# Altium schematic symbol library jlcpcb_2025_04_capacitors_extended_0201.schlib: 1175 symbols (part 5 of 7) (continued)
## GRM0335C1E160GA01D
designator C?  Capacitance: 16pF  (hidden comment: *)
Capacitor, Ceramic (MLCC), 16pF, ±2%, 25V, C0G, ±2%, SMD 0201; Manufacturer: Murata Electronics; Manufacturer Part Number: GRM0335C1E160GA01D; Package Size: 0201; JLCPCB Basic Part: No; JLCPCB Part Number: C3034518; Supplier 1: LCSC; Category: Capacitors - MLCC; Supplier Part Number 1: C3034518; Tolerance: ±2%; Voltage Rating: 25V; Temperature Coefficient: C0G; RoHS: Yes; ComponentLink1Description: Datasheet; ComponentLink1URL: https://wmsc.lcsc.com/wmsc/upload/file/pdf/v2/lcsc/2209091800_Murata-Electronics-GRM0335C1E160GA01D_C3034518.pdf; ComponentLink2Description: JLCPCB Part URL; ComponentLink2URL: https://jlcpcb.com/partdetail/C3034518; ComponentLink3Description: LCSC Part URL; ComponentLink3URL: https://lcsc.com/product-detail/Multilayer-Ceramic-Capacitors-MLCC---SMD-SMT_Murata-Electronics-Murata-Electronics-GRM0335C1E160GA01D_C3034518.html
footprint CAP-0201 (0201 (0603M) Capacitor)
pins: 1, 2

## GRM0335C1E160JA01D
designator C?  Capacitance: 16pF  (hidden comment: *)
Capacitor, Ceramic (MLCC), 16pF, ±5%, 25V, C0G, ±5%, SMD 0201; Manufacturer: Murata Electronics; Manufacturer Part Number: GRM0335C1E160JA01D; Package Size: 0201; JLCPCB Basic Part: No; JLCPCB Part Number: C3034517; Supplier 1: LCSC; Category: Capacitors - MLCC; Supplier Part Number 1: C3034517; Tolerance: ±5%; Voltage Rating: 25V; Temperature Coefficient: C0G; RoHS: Yes; ComponentLink1Description: Datasheet; ComponentLink1URL: https://wmsc.lcsc.com/wmsc/upload/file/pdf/v2/lcsc/2209091800_Murata-Electronics-GRM0335C1E160JA01D_C3034517.pdf; ComponentLink2Description: JLCPCB Part URL; ComponentLink2URL: https://jlcpcb.com/partdetail/C3034517; ComponentLink3Description: LCSC Part URL; ComponentLink3URL: https://lcsc.com/product-detail/Multilayer-Ceramic-Capacitors-MLCC---SMD-SMT_Murata-Electronics-Murata-Electronics-GRM0335C1E160JA01D_C3034517.html
footprint CAP-0201 (0201 (0603M) Capacitor)
pins: 1, 2

## GRM0335C1E180GA01D
designator C?  Capacitance: 18pF  (hidden comment: *)
Capacitor, Ceramic (MLCC), 18pF, ±2%, 25V, C0G, ±2%, SMD 0201; Manufacturer: Murata Electronics; Manufacturer Part Number: GRM0335C1E180GA01D; Package Size: 0201; JLCPCB Basic Part: No; JLCPCB Part Number: C161374; Supplier 1: LCSC; Category: Capacitors - MLCC; Supplier Part Number 1: C161374; Tolerance: ±2%; Voltage Rating: 25V; Temperature Coefficient: C0G; RoHS: Yes; ComponentLink1Description: Datasheet; ComponentLink1URL: https://wmsc.lcsc.com/wmsc/upload/file/pdf/v2/lcsc/1811081551_Murata-Electronics-GRM0335C1E180GA01D_C161374.pdf; ComponentLink2Description: JLCPCB Part URL; ComponentLink2URL: https://jlcpcb.com/partdetail/C161374; ComponentLink3Description: LCSC Part URL; ComponentLink3URL: https://lcsc.com/product-detail/Multilayer-Ceramic-Capacitors-MLCC---SMD-SMT_Murata-Electronics-Murata-Electronics-GRM0335C1E180GA01D_C161374.html
footprint CAP-0201 (0201 (0603M) Capacitor)
pins: 1, 2

## GRM0335C1E180JA01D
designator C?  Capacitance: 18pF  (hidden comment: *)
Capacitor, Ceramic (MLCC), 18pF, ±5%, 25V, C0G, ±5%, SMD 0201; Manufacturer: Murata Electronics; Manufacturer Part Number: GRM0335C1E180JA01D; Package Size: 0201; JLCPCB Basic Part: No; JLCPCB Part Number: C161375; Supplier 1: LCSC; Category: Capacitors - MLCC; Supplier Part Number 1: C161375; Tolerance: ±5%; Voltage Rating: 25V; Temperature Coefficient: C0G; RoHS: Yes; ComponentLink1Description: Datasheet; ComponentLink1URL: https://wmsc.lcsc.com/wmsc/upload/file/pdf/v2/lcsc/1912111437_Murata-Electronics-GRM0335C1E180JA01D_C161375.pdf; ComponentLink2Description: JLCPCB Part URL; ComponentLink2URL: https://jlcpcb.com/partdetail/C161375; ComponentLink3Description: LCSC Part URL; ComponentLink3URL: https://lcsc.com/product-detail/Multilayer-Ceramic-Capacitors-MLCC---SMD-SMT_Murata-Electronics-Murata-Electronics-GRM0335C1E180JA01D_C161375.html
footprint CAP-0201 (0201 (0603M) Capacitor)
pins: 1, 2

## GRM0335C1E200JA01D
designator C?  Capacitance: 20pF  (hidden comment: *)
Capacitor, Ceramic (MLCC), 20pF, ±5%, 25V, C0G, ±5%, SMD 0201; Manufacturer: Murata Electronics; Manufacturer Part Number: GRM0335C1E200JA01D; Package Size: 0201; JLCPCB Basic Part: No; JLCPCB Part Number: C426053; Supplier 1: LCSC; Category: Capacitors - MLCC; Supplier Part Number 1: C426053; Tolerance: ±5%; Voltage Rating: 25V; Temperature Coefficient: C0G; RoHS: Yes; ComponentLink1Description: Datasheet; ComponentLink1URL: https://wmsc.lcsc.com/wmsc/upload/file/pdf/v2/lcsc/2304140030_Murata-Electronics-GRM0335C1E200JA01D_C426053.pdf; ComponentLink2Description: JLCPCB Part URL; ComponentLink2URL: https://jlcpcb.com/partdetail/C426053; ComponentLink3Description: LCSC Part URL; ComponentLink3URL: https://lcsc.com/product-detail/Multilayer-Ceramic-Capacitors-MLCC---SMD-SMT_Murata-Electronics-Murata-Electronics-GRM0335C1E200JA01D_C426053.html
footprint CAP-0201 (0201 (0603M) Capacitor)
pins: 1, 2

## GRM0335C1E220FA01D
designator C?  Capacitance: 22pF  (hidden comment: *)
Capacitor, Ceramic (MLCC), 22pF, ±1%, 25V, C0G, ±1%, SMD 0201; Manufacturer: Murata Electronics; Manufacturer Part Number: GRM0335C1E220FA01D; Package Size: 0201; JLCPCB Basic Part: No; JLCPCB Part Number: C464960; Supplier 1: LCSC; Category: Capacitors - MLCC; Supplier Part Number 1: C464960; Tolerance: ±1%; Voltage Rating: 25V; Temperature Coefficient: C0G; RoHS: Yes; ComponentLink1Description: Datasheet; ComponentLink1URL: https://wmsc.lcsc.com/wmsc/upload/file/pdf/v2/lcsc/1912111437_Murata-Electronics-GRM0335C1E220FA01D_C464960.pdf; ComponentLink2Description: JLCPCB Part URL; ComponentLink2URL: https://jlcpcb.com/partdetail/C464960; ComponentLink3Description: LCSC Part URL; ComponentLink3URL: https://lcsc.com/product-detail/Multilayer-Ceramic-Capacitors-MLCC---SMD-SMT_Murata-Electronics-Murata-Electronics-GRM0335C1E220FA01D_C464960.html
footprint CAP-0201 (0201 (0603M) Capacitor)
pins: 1, 2

## GRM0335C1E220GA01D
designator C?  Capacitance: 22pF  (hidden comment: *)
Capacitor, Ceramic (MLCC), 22pF, ±2%, 25V, null, ±2%, SMD 0201; Manufacturer: Murata Electronics; Manufacturer Part Number: GRM0335C1E220GA01D; Package Size: 0201; JLCPCB Basic Part: No; JLCPCB Part Number: C710796; Supplier 1: LCSC; Category: Capacitors - MLCC; Supplier Part Number 1: C710796; Tolerance: ±2%; Voltage Rating: 25V; Temperature Coefficient: null; RoHS: Yes; ComponentLink1Description: Datasheet; ComponentLink1URL: https://wmsc.lcsc.com/wmsc/upload/file/pdf/v2/lcsc/2304140030_Murata-Electronics-GRM0335C1E220GA01D_C710796.pdf; ComponentLink2Description: JLCPCB Part URL; ComponentLink2URL: https://jlcpcb.com/partdetail/C710796; ComponentLink3Description: LCSC Part URL; ComponentLink3URL: https://lcsc.com/product-detail/Multilayer-Ceramic-Capacitors-MLCC---SMD-SMT_Murata-Electronics-Murata-Electronics-GRM0335C1E220GA01D_C710796.html
footprint CAP-0201 (0201 (0603M) Capacitor)
pins: 1, 2

## GRM0335C1E220JA01D
designator C?  Capacitance: 22pF  (hidden comment: *)
Capacitor, Ceramic (MLCC), 22pF, ±5%, 25V, C0G, ±5%, SMD 0201; Manufacturer: Murata Electronics; Manufacturer Part Number: GRM0335C1E220JA01D; Package Size: 0201; JLCPCB Basic Part: No; JLCPCB Part Number: C76919; Supplier 1: LCSC; Category: Capacitors - MLCC; Supplier Part Number 1: C76919; Tolerance: ±5%; Voltage Rating: 25V; Temperature Coefficient: C0G; RoHS: Yes; ComponentLink1Description: Datasheet; ComponentLink1URL: https://wmsc.lcsc.com/wmsc/upload/file/pdf/v2/lcsc/1811081513_Murata-Electronics-GRM0335C1E220JA01D_C76919.pdf; ComponentLink2Description: JLCPCB Part URL; ComponentLink2URL: https://jlcpcb.com/partdetail/C76919; ComponentLink3Description: LCSC Part URL; ComponentLink3URL: https://lcsc.com/product-detail/Multilayer-Ceramic-Capacitors-MLCC---SMD-SMT_Murata-Electronics-Murata-Electronics-GRM0335C1E220JA01D_C76919.html
footprint CAP-0201 (0201 (0603M) Capacitor)
pins: 1, 2

## GRM0335C1E220JA01J
designator C?  Capacitance: 22pF  (hidden comment: *)
Capacitor, Ceramic (MLCC), 22pF, ±5%, 25V, C0G, ±5%, SMD 0201; Manufacturer: Murata Electronics; Manufacturer Part Number: GRM0335C1E220JA01J; Package Size: 0201; JLCPCB Basic Part: No; JLCPCB Part Number: C490387; Supplier 1: LCSC; Category: Capacitors - MLCC; Supplier Part Number 1: C490387; Tolerance: ±5%; Voltage Rating: 25V; Temperature Coefficient: C0G; RoHS: Yes; ComponentLink1Description: Datasheet; ComponentLink1URL: https://wmsc.lcsc.com/wmsc/upload/file/pdf/v2/lcsc/2304140030_Murata-Electronics-GRM0335C1E220JA01J_C490387.pdf; ComponentLink2Description: JLCPCB Part URL; ComponentLink2URL: https://jlcpcb.com/partdetail/C490387; ComponentLink3Description: LCSC Part URL; ComponentLink3URL: https://lcsc.com/product-detail/Multilayer-Ceramic-Capacitors-MLCC---SMD-SMT_Murata-Electronics-Murata-Electronics-GRM0335C1E220JA01J_C490387.html
footprint CAP-0201 (0201 (0603M) Capacitor)
pins: 1, 2

## GRM0335C1E221JA01D
designator C?  Capacitance: 220pF  (hidden comment: *)
Capacitor, Ceramic (MLCC), 220pF, ±5%, 25V, C0G, ±5%, SMD 0201; Manufacturer: Murata Electronics; Manufacturer Part Number: GRM0335C1E221JA01D; Package Size: 0201; JLCPCB Basic Part: No; JLCPCB Part Number: C907939; Supplier 1: LCSC; Category: Capacitors - MLCC; Supplier Part Number 1: C907939; Tolerance: ±5%; Voltage Rating: 25V; Temperature Coefficient: C0G; RoHS: Yes; ComponentLink1Description: Datasheet; ComponentLink1URL: https://wmsc.lcsc.com/wmsc/upload/file/pdf/v2/lcsc/2201242100_Murata-Electronics-GRM0335C1E221JA01D_C907939.pdf; ComponentLink2Description: JLCPCB Part URL; ComponentLink2URL: https://jlcpcb.com/partdetail/C907939; ComponentLink3Description: LCSC Part URL; ComponentLink3URL: https://lcsc.com/product-detail/Multilayer-Ceramic-Capacitors-MLCC---SMD-SMT_Murata-Electronics-Murata-Electronics-GRM0335C1E221JA01D_C907939.html
footprint CAP-0201 (0201 (0603M) Capacitor)
pins: 1, 2

## GRM0335C1E270FA01D
designator C?  Capacitance: 27pF  (hidden comment: *)
Capacitor, Ceramic (MLCC), 27pF, ±1%, 25V, C0G, ±1%, SMD 0201; Manufacturer: Murata Electronics; Manufacturer Part Number: GRM0335C1E270FA01D; Package Size: 0201; JLCPCB Basic Part: No; JLCPCB Part Number: C710798; Supplier 1: LCSC; Category: Capacitors - MLCC; Supplier Part Number 1: C710798; Tolerance: ±1%; Voltage Rating: 25V; Temperature Coefficient: C0G; RoHS: Yes; ComponentLink1Description: Datasheet; ComponentLink1URL: https://wmsc.lcsc.com/wmsc/upload/file/pdf/v2/lcsc/2210190600_Murata-Electronics-GRM0335C1E270FA01D_C710798.pdf; ComponentLink2Description: JLCPCB Part URL; ComponentLink2URL: https://jlcpcb.com/partdetail/C710798; ComponentLink3Description: LCSC Part URL; ComponentLink3URL: https://lcsc.com/product-detail/Multilayer-Ceramic-Capacitors-MLCC---SMD-SMT_Murata-Electronics-Murata-Electronics-GRM0335C1E270FA01D_C710798.html
footprint CAP-0201 (0201 (0603M) Capacitor)
pins: 1, 2

## GRM0335C1E270JA01D
designator C?  Capacitance: 27pF  (hidden comment: *)
Capacitor, Ceramic (MLCC), 27pF, ±5%, 25V, C0G, ±5%, SMD 0201; Manufacturer: Murata Electronics; Manufacturer Part Number: GRM0335C1E270JA01D; Package Size: 0201; JLCPCB Basic Part: No; JLCPCB Part Number: C161381; Supplier 1: LCSC; Category: Capacitors - MLCC; Supplier Part Number 1: C161381; Tolerance: ±5%; Voltage Rating: 25V; Temperature Coefficient: C0G; RoHS: Yes; ComponentLink1Description: Datasheet; ComponentLink1URL: https://wmsc.lcsc.com/wmsc/upload/file/pdf/v2/lcsc/1811081545_Murata-Electronics-GRM0335C1E270JA01D_C161381.pdf; ComponentLink2Description: JLCPCB Part URL; ComponentLink2URL: https://jlcpcb.com/partdetail/C161381; ComponentLink3Description: LCSC Part URL; ComponentLink3URL: https://lcsc.com/product-detail/Multilayer-Ceramic-Capacitors-MLCC---SMD-SMT_Murata-Electronics-Murata-Electronics-GRM0335C1E270JA01D_C161381.html
footprint CAP-0201 (0201 (0603M) Capacitor)
pins: 1, 2

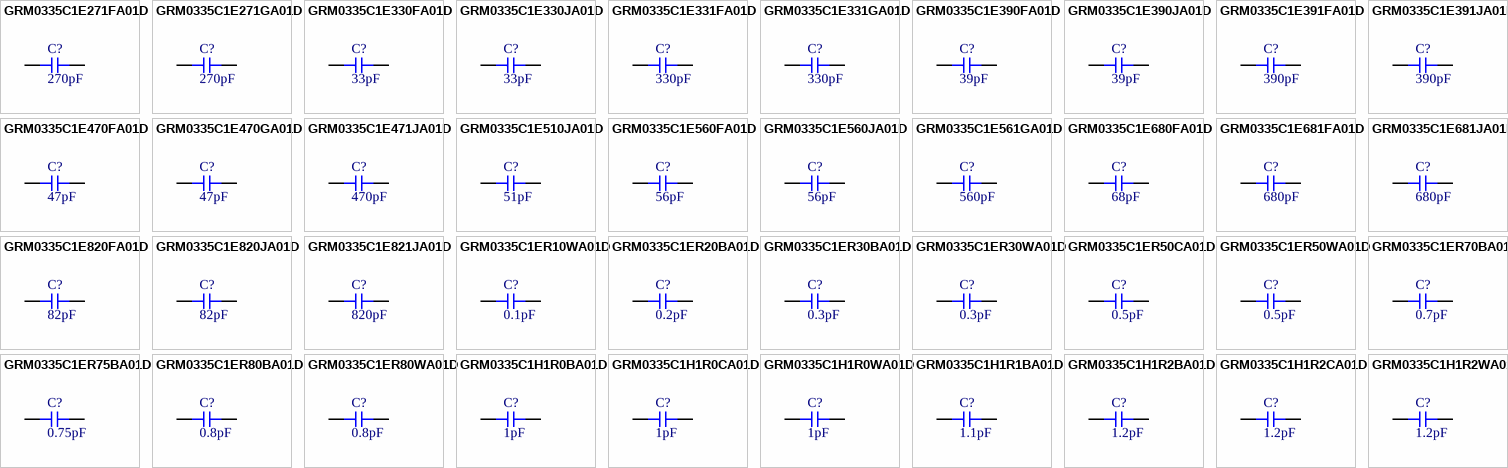
[diagram p21: symbols GRM0335C1E271FA01D to GRM0335C1H1R2WA01D]

## GRM0335C1E271FA01D
designator C?  Capacitance: 270pF  (hidden comment: *)
Capacitor, Ceramic (MLCC), 270pF, ±1%, 25V, C0G, ±1%, SMD 0201; Manufacturer: Murata Electronics; Manufacturer Part Number: GRM0335C1E271FA01D; Package Size: 0201; JLCPCB Basic Part: No; JLCPCB Part Number: C1864394; Supplier 1: LCSC; Category: Capacitors - MLCC; Supplier Part Number 1: C1864394; Tolerance: ±1%; Voltage Rating: 25V; Temperature Coefficient: C0G; RoHS: Yes; ComponentLink1Description: Datasheet; ComponentLink1URL: https://wmsc.lcsc.com/wmsc/upload/file/pdf/v2/lcsc/2201271800_Murata-Electronics-GRM0335C1E271FA01D_C1864394.pdf; ComponentLink2Description: JLCPCB Part URL; ComponentLink2URL: https://jlcpcb.com/partdetail/C1864394; ComponentLink3Description: LCSC Part URL; ComponentLink3URL: https://lcsc.com/product-detail/Multilayer-Ceramic-Capacitors-MLCC---SMD-SMT_Murata-Electronics-Murata-Electronics-GRM0335C1E271FA01D_C1864394.html
footprint CAP-0201 (0201 (0603M) Capacitor)
pins: 1, 2

## GRM0335C1E271GA01D
designator C?  Capacitance: 270pF  (hidden comment: *)
Capacitor, Ceramic (MLCC), 270pF, ±2%, 25V, C0G, ±2%, SMD 0201; Manufacturer: Murata Electronics; Manufacturer Part Number: GRM0335C1E271GA01D; Package Size: 0201; JLCPCB Basic Part: No; JLCPCB Part Number: C384945; Supplier 1: LCSC; Category: Capacitors - MLCC; Supplier Part Number 1: C384945; Tolerance: ±2%; Voltage Rating: 25V; Temperature Coefficient: C0G; RoHS: Yes; ComponentLink1Description: Datasheet; ComponentLink1URL: https://wmsc.lcsc.com/wmsc/upload/file/pdf/v2/lcsc/2210192300_Murata-Electronics-GRM0335C1E271GA01D_C384945.pdf; ComponentLink2Description: JLCPCB Part URL; ComponentLink2URL: https://jlcpcb.com/partdetail/C384945; ComponentLink3Description: LCSC Part URL; ComponentLink3URL: https://lcsc.com/product-detail/Multilayer-Ceramic-Capacitors-MLCC---SMD-SMT_Murata-Electronics-Murata-Electronics-GRM0335C1E271GA01D_C384945.html
footprint CAP-0201 (0201 (0603M) Capacitor)
pins: 1, 2

## GRM0335C1E330FA01D
designator C?  Capacitance: 33pF  (hidden comment: *)
Capacitor, Ceramic (MLCC), 33pF, ±1%, 25V, C0G, ±1%, SMD 0201; Manufacturer: Murata Electronics; Manufacturer Part Number: GRM0335C1E330FA01D; Package Size: 0201; JLCPCB Basic Part: No; JLCPCB Part Number: C668338; Supplier 1: LCSC; Category: Capacitors - MLCC; Supplier Part Number 1: C668338; Tolerance: ±1%; Voltage Rating: 25V; Temperature Coefficient: C0G; RoHS: Yes; ComponentLink1Description: Datasheet; ComponentLink1URL: https://wmsc.lcsc.com/wmsc/upload/file/pdf/v2/lcsc/2201111000_Murata-Electronics-GRM0335C1E330FA01D_C668338.pdf; ComponentLink2Description: JLCPCB Part URL; ComponentLink2URL: https://jlcpcb.com/partdetail/C668338; ComponentLink3Description: LCSC Part URL; ComponentLink3URL: https://lcsc.com/product-detail/Multilayer-Ceramic-Capacitors-MLCC---SMD-SMT_Murata-Electronics-Murata-Electronics-GRM0335C1E330FA01D_C668338.html
footprint CAP-0201 (0201 (0603M) Capacitor)
pins: 1, 2

## GRM0335C1E330JA01D
designator C?  Capacitance: 33pF  (hidden comment: *)
Capacitor, Ceramic (MLCC), 33pF, ±5%, 25V, C0G, ±5%, SMD 0201; Manufacturer: Murata Electronics; Manufacturer Part Number: GRM0335C1E330JA01D; Package Size: 0201; JLCPCB Basic Part: No; JLCPCB Part Number: C88906; Supplier 1: LCSC; Category: Capacitors - MLCC; Supplier Part Number 1: C88906; Tolerance: ±5%; Voltage Rating: 25V; Temperature Coefficient: C0G; RoHS: Yes; ComponentLink1Description: Datasheet; ComponentLink1URL: https://wmsc.lcsc.com/wmsc/upload/file/pdf/v2/lcsc/2304140030_Murata-Electronics-GRM0335C1E330JA01D_C88906.pdf; ComponentLink2Description: JLCPCB Part URL; ComponentLink2URL: https://jlcpcb.com/partdetail/C88906; ComponentLink3Description: LCSC Part URL; ComponentLink3URL: https://lcsc.com/product-detail/Multilayer-Ceramic-Capacitors-MLCC---SMD-SMT_Murata-Electronics-Murata-Electronics-GRM0335C1E330JA01D_C88906.html
footprint CAP-0201 (0201 (0603M) Capacitor)
pins: 1, 2

## GRM0335C1E331FA01D
designator C?  Capacitance: 330pF  (hidden comment: *)
Capacitor, Ceramic (MLCC), 330pF, ±1%, 25V, C0G, ±1%, SMD 0201; Manufacturer: Murata Electronics; Manufacturer Part Number: GRM0335C1E331FA01D; Package Size: 0201; JLCPCB Basic Part: No; JLCPCB Part Number: C3034513; Supplier 1: LCSC; Category: Capacitors - MLCC; Supplier Part Number 1: C3034513; Tolerance: ±1%; Voltage Rating: 25V; Temperature Coefficient: C0G; RoHS: Yes; ComponentLink1Description: Datasheet; ComponentLink1URL: https://wmsc.lcsc.com/wmsc/upload/file/pdf/v2/lcsc/2209091800_Murata-Electronics-GRM0335C1E331FA01D_C3034513.pdf; ComponentLink2Description: JLCPCB Part URL; ComponentLink2URL: https://jlcpcb.com/partdetail/C3034513; ComponentLink3Description: LCSC Part URL; ComponentLink3URL: https://lcsc.com/product-detail/Multilayer-Ceramic-Capacitors-MLCC---SMD-SMT_Murata-Electronics-Murata-Electronics-GRM0335C1E331FA01D_C3034513.html
footprint CAP-0201 (0201 (0603M) Capacitor)
pins: 1, 2

## GRM0335C1E331GA01D
designator C?  Capacitance: 330pF  (hidden comment: *)
Capacitor, Ceramic (MLCC), 330pF, ±2%, 25V, C0G, ±2%, SMD 0201; Manufacturer: Murata Electronics; Manufacturer Part Number: GRM0335C1E331GA01D; Package Size: 0201; JLCPCB Basic Part: No; JLCPCB Part Number: C437509; Supplier 1: LCSC; Category: Capacitors - MLCC; Supplier Part Number 1: C437509; Tolerance: ±2%; Voltage Rating: 25V; Temperature Coefficient: C0G; RoHS: Yes; ComponentLink1Description: Datasheet; ComponentLink1URL: https://wmsc.lcsc.com/wmsc/upload/file/pdf/v2/lcsc/2304140030_Murata-Electronics-GRM0335C1E331GA01D_C437509.pdf; ComponentLink2Description: JLCPCB Part URL; ComponentLink2URL: https://jlcpcb.com/partdetail/C437509; ComponentLink3Description: LCSC Part URL; ComponentLink3URL: https://lcsc.com/product-detail/Multilayer-Ceramic-Capacitors-MLCC---SMD-SMT_Murata-Electronics-Murata-Electronics-GRM0335C1E331GA01D_C437509.html
footprint CAP-0201 (0201 (0603M) Capacitor)
pins: 1, 2

## GRM0335C1E390FA01D
designator C?  Capacitance: 39pF  (hidden comment: *)
Capacitor, Ceramic (MLCC), 39pF, ±1%, 25V, C0G, ±1%, SMD 0201; Manufacturer: Murata Electronics; Manufacturer Part Number: GRM0335C1E390FA01D; Package Size: 0201; JLCPCB Basic Part: No; JLCPCB Part Number: C3011647; Supplier 1: LCSC; Category: Capacitors - MLCC; Supplier Part Number 1: C3011647; Tolerance: ±1%; Voltage Rating: 25V; Temperature Coefficient: C0G; RoHS: Yes; ComponentLink1Description: Datasheet; ComponentLink1URL: https://wmsc.lcsc.com/wmsc/upload/file/pdf/v2/lcsc/2209091800_Murata-Electronics-GRM0335C1E390FA01D_C3011647.pdf; ComponentLink2Description: JLCPCB Part URL; ComponentLink2URL: https://jlcpcb.com/partdetail/C3011647; ComponentLink3Description: LCSC Part URL; ComponentLink3URL: https://lcsc.com/product-detail/Multilayer-Ceramic-Capacitors-MLCC---SMD-SMT_Murata-Electronics-Murata-Electronics-GRM0335C1E390FA01D_C3011647.html
footprint CAP-0201 (0201 (0603M) Capacitor)
pins: 1, 2

## GRM0335C1E390JA01D
designator C?  Capacitance: 39pF  (hidden comment: *)
Capacitor, Ceramic (MLCC), 39pF, ±5%, 25V, C0G, ±5%, SMD 0201; Manufacturer: Murata Electronics; Manufacturer Part Number: GRM0335C1E390JA01D; Package Size: 0201; JLCPCB Basic Part: No; JLCPCB Part Number: C161387; Supplier 1: LCSC; Category: Capacitors - MLCC; Supplier Part Number 1: C161387; Tolerance: ±5%; Voltage Rating: 25V; Temperature Coefficient: C0G; RoHS: Yes; ComponentLink1Description: Datasheet; ComponentLink1URL: https://wmsc.lcsc.com/wmsc/upload/file/pdf/v2/lcsc/2304140030_Murata-Electronics-GRM0335C1E390JA01D_C161387.pdf; ComponentLink2Description: JLCPCB Part URL; ComponentLink2URL: https://jlcpcb.com/partdetail/C161387; ComponentLink3Description: LCSC Part URL; ComponentLink3URL: https://lcsc.com/product-detail/Multilayer-Ceramic-Capacitors-MLCC---SMD-SMT_Murata-Electronics-Murata-Electronics-GRM0335C1E390JA01D_C161387.html
footprint CAP-0201 (0201 (0603M) Capacitor)
pins: 1, 2

## GRM0335C1E391FA01D
designator C?  Capacitance: 390pF  (hidden comment: *)
Capacitor, Ceramic (MLCC), 390pF, ±1%, 25V, C0G, ±1%, SMD 0201; Manufacturer: Murata Electronics; Manufacturer Part Number: GRM0335C1E391FA01D; Package Size: 0201; JLCPCB Basic Part: No; JLCPCB Part Number: C384947; Supplier 1: LCSC; Category: Capacitors - MLCC; Supplier Part Number 1: C384947; Tolerance: ±1%; Voltage Rating: 25V; Temperature Coefficient: C0G; RoHS: Yes; ComponentLink1Description: Datasheet; ComponentLink1URL: https://wmsc.lcsc.com/wmsc/upload/file/pdf/v2/lcsc/1912111437_Murata-Electronics-GRM0335C1E391FA01D_C384947.pdf; ComponentLink2Description: JLCPCB Part URL; ComponentLink2URL: https://jlcpcb.com/partdetail/C384947; ComponentLink3Description: LCSC Part URL; ComponentLink3URL: https://lcsc.com/product-detail/Multilayer-Ceramic-Capacitors-MLCC---SMD-SMT_Murata-Electronics-Murata-Electronics-GRM0335C1E391FA01D_C384947.html
footprint CAP-0201 (0201 (0603M) Capacitor)
pins: 1, 2

## GRM0335C1E391JA01D
designator C?  Capacitance: 390pF  (hidden comment: *)
Capacitor, Ceramic (MLCC), 390pF, ±5%, 25V, C0G, ±5%, SMD 0201; Manufacturer: Murata Electronics; Manufacturer Part Number: GRM0335C1E391JA01D; Package Size: 0201; JLCPCB Basic Part: No; JLCPCB Part Number: C384948; Supplier 1: LCSC; Category: Capacitors - MLCC; Supplier Part Number 1: C384948; Tolerance: ±5%; Voltage Rating: 25V; Temperature Coefficient: C0G; RoHS: Yes; ComponentLink1Description: Datasheet; ComponentLink1URL: https://wmsc.lcsc.com/wmsc/upload/file/pdf/v2/lcsc/2304140030_Murata-Electronics-GRM0335C1E391JA01D_C384948.pdf; ComponentLink2Description: JLCPCB Part URL; ComponentLink2URL: https://jlcpcb.com/partdetail/C384948; ComponentLink3Description: LCSC Part URL; ComponentLink3URL: https://lcsc.com/product-detail/Multilayer-Ceramic-Capacitors-MLCC---SMD-SMT_Murata-Electronics-Murata-Electronics-GRM0335C1E391JA01D_C384948.html
footprint CAP-0201 (0201 (0603M) Capacitor)
pins: 1, 2

## GRM0335C1E470FA01D
designator C?  Capacitance: 47pF  (hidden comment: *)
Capacitor, Ceramic (MLCC), 47pF, ±1%, 25V, C0G, ±1%, SMD 0201; Manufacturer: Murata Electronics; Manufacturer Part Number: GRM0335C1E470FA01D; Package Size: 0201; JLCPCB Basic Part: No; JLCPCB Part Number: C710800; Supplier 1: LCSC; Category: Capacitors - MLCC; Supplier Part Number 1: C710800; Tolerance: ±1%; Voltage Rating: 25V; Temperature Coefficient: C0G; RoHS: Yes; ComponentLink1Description: Datasheet; ComponentLink1URL: https://wmsc.lcsc.com/wmsc/upload/file/pdf/v2/lcsc/2210190600_Murata-Electronics-GRM0335C1E470FA01D_C710800.pdf; ComponentLink2Description: JLCPCB Part URL; ComponentLink2URL: https://jlcpcb.com/partdetail/C710800; ComponentLink3Description: LCSC Part URL; ComponentLink3URL: https://lcsc.com/product-detail/Multilayer-Ceramic-Capacitors-MLCC---SMD-SMT_Murata-Electronics-Murata-Electronics-GRM0335C1E470FA01D_C710800.html
footprint CAP-0201 (0201 (0603M) Capacitor)
pins: 1, 2

## GRM0335C1E470GA01D
designator C?  Capacitance: 47pF  (hidden comment: *)
Capacitor, Ceramic (MLCC), 47pF, ±2%, 25V, null, ±2%, SMD 0201; Manufacturer: Murata Electronics; Manufacturer Part Number: GRM0335C1E470GA01D; Package Size: 0201; JLCPCB Basic Part: No; JLCPCB Part Number: C2168172; Supplier 1: LCSC; Category: Capacitors - MLCC; Supplier Part Number 1: C2168172; Tolerance: ±2%; Voltage Rating: 25V; Temperature Coefficient: null; RoHS: Yes; ComponentLink1Description: Datasheet; ComponentLink1URL: https://wmsc.lcsc.com/wmsc/upload/file/pdf/v2/lcsc/2304140030_Murata-Electronics-GRM0335C1E470GA01D_C2168172.pdf; ComponentLink2Description: JLCPCB Part URL; ComponentLink2URL: https://jlcpcb.com/partdetail/C2168172; ComponentLink3Description: LCSC Part URL; ComponentLink3URL: https://lcsc.com/product-detail/Multilayer-Ceramic-Capacitors-MLCC---SMD-SMT_Murata-Electronics-Murata-Electronics-GRM0335C1E470GA01D_C2168172.html
footprint CAP-0201 (0201 (0603M) Capacitor)
pins: 1, 2

## GRM0335C1E471JA01D
designator C?  Capacitance: 470pF  (hidden comment: *)
Capacitor, Ceramic (MLCC), 470pF, ±5%, 25V, C0G, ±5%, SMD 0201; Manufacturer: Murata Electronics; Manufacturer Part Number: GRM0335C1E471JA01D; Package Size: 0201; JLCPCB Basic Part: No; JLCPCB Part Number: C161390; Supplier 1: LCSC; Category: Capacitors - MLCC; Supplier Part Number 1: C161390; Tolerance: ±5%; Voltage Rating: 25V; Temperature Coefficient: C0G; RoHS: Yes; ComponentLink1Description: Datasheet; ComponentLink1URL: https://wmsc.lcsc.com/wmsc/upload/file/pdf/v2/lcsc/2304140030_Murata-Electronics-GRM0335C1E471JA01D_C161390.pdf; ComponentLink2Description: JLCPCB Part URL; ComponentLink2URL: https://jlcpcb.com/partdetail/C161390; ComponentLink3Description: LCSC Part URL; ComponentLink3URL: https://lcsc.com/product-detail/Multilayer-Ceramic-Capacitors-MLCC---SMD-SMT_Murata-Electronics-Murata-Electronics-GRM0335C1E471JA01D_C161390.html
footprint CAP-0201 (0201 (0603M) Capacitor)
pins: 1, 2

## GRM0335C1E510JA01D
designator C?  Capacitance: 51pF  (hidden comment: *)
Capacitor, Ceramic (MLCC), 51pF, ±5%, 25V, null, ±5%, SMD 0201; Manufacturer: Murata Electronics; Manufacturer Part Number: GRM0335C1E510JA01D; Package Size: 0201; JLCPCB Basic Part: No; JLCPCB Part Number: C2180512; Supplier 1: LCSC; Category: Capacitors - MLCC; Supplier Part Number 1: C2180512; Tolerance: ±5%; Voltage Rating: 25V; Temperature Coefficient: null; RoHS: Yes; ComponentLink1Description: Datasheet; ComponentLink1URL: https://wmsc.lcsc.com/wmsc/upload/file/pdf/v2/lcsc/2202041130_Murata-Electronics-GRM0335C1E510JA01D_C2180512.pdf; ComponentLink2Description: JLCPCB Part URL; ComponentLink2URL: https://jlcpcb.com/partdetail/C2180512; ComponentLink3Description: LCSC Part URL; ComponentLink3URL: https://lcsc.com/product-detail/Multilayer-Ceramic-Capacitors-MLCC---SMD-SMT_Murata-Electronics-Murata-Electronics-GRM0335C1E510JA01D_C2180512.html
footprint CAP-0201 (0201 (0603M) Capacitor)
pins: 1, 2

## GRM0335C1E560FA01D
designator C?  Capacitance: 56pF  (hidden comment: *)
Capacitor, Ceramic (MLCC), 56pF, ±1%, 25V, ±1%, SMD 0201; Manufacturer: Murata Electronics; Manufacturer Part Number: GRM0335C1E560FA01D; Package Size: 0201; JLCPCB Basic Part: No; JLCPCB Part Number: C2173785; Supplier 1: LCSC; Category: Capacitors - MLCC; Supplier Part Number 1: C2173785; Tolerance: ±1%; Voltage Rating: 25V; RoHS: Yes; ComponentLink1Description: Datasheet; ComponentLink1URL: https://wmsc.lcsc.com/wmsc/upload/file/pdf/v2/lcsc/2304140030_Murata-Electronics-GRM0335C1E560FA01D_C2173785.pdf; ComponentLink2Description: JLCPCB Part URL; ComponentLink2URL: https://jlcpcb.com/partdetail/C2173785; ComponentLink3Description: LCSC Part URL; ComponentLink3URL: https://lcsc.com/product-detail/Multilayer-Ceramic-Capacitors-MLCC---SMD-SMT_Murata-Electronics-Murata-Electronics-GRM0335C1E560FA01D_C2173785.html
footprint CAP-0201 (0201 (0603M) Capacitor)
pins: 1, 2

## GRM0335C1E560JA01D
designator C?  Capacitance: 56pF  (hidden comment: *)
Capacitor, Ceramic (MLCC), 56pF, ±5%, 25V, C0G, ±5%, SMD 0201; Manufacturer: Murata Electronics; Manufacturer Part Number: GRM0335C1E560JA01D; Package Size: 0201; JLCPCB Basic Part: No; JLCPCB Part Number: C161392; Supplier 1: LCSC; Category: Capacitors - MLCC; Supplier Part Number 1: C161392; Tolerance: ±5%; Voltage Rating: 25V; Temperature Coefficient: C0G; RoHS: Yes; ComponentLink1Description: Datasheet; ComponentLink1URL: https://wmsc.lcsc.com/wmsc/upload/file/pdf/v2/lcsc/1912111437_Murata-Electronics-GRM0335C1E560JA01D_C161392.pdf; ComponentLink2Description: JLCPCB Part URL; ComponentLink2URL: https://jlcpcb.com/partdetail/C161392; ComponentLink3Description: LCSC Part URL; ComponentLink3URL: https://lcsc.com/product-detail/Multilayer-Ceramic-Capacitors-MLCC---SMD-SMT_Murata-Electronics-Murata-Electronics-GRM0335C1E560JA01D_C161392.html
footprint CAP-0201 (0201 (0603M) Capacitor)
pins: 1, 2

## GRM0335C1E561GA01D
designator C?  Capacitance: 560pF  (hidden comment: *)
Capacitor, Ceramic (MLCC), 560pF, ±2%, 25V, C0G, ±2%, SMD 0201; Manufacturer: Murata Electronics; Manufacturer Part Number: GRM0335C1E561GA01D; Package Size: 0201; JLCPCB Basic Part: No; JLCPCB Part Number: C426059; Supplier 1: LCSC; Category: Capacitors - MLCC; Supplier Part Number 1: C426059; Tolerance: ±2%; Voltage Rating: 25V; Temperature Coefficient: C0G; RoHS: Yes; ComponentLink1Description: Datasheet; ComponentLink1URL: https://wmsc.lcsc.com/wmsc/upload/file/pdf/v2/lcsc/2304140030_Murata-Electronics-GRM0335C1E561GA01D_C426059.pdf; ComponentLink2Description: JLCPCB Part URL; ComponentLink2URL: https://jlcpcb.com/partdetail/C426059; ComponentLink3Description: LCSC Part URL; ComponentLink3URL: https://lcsc.com/product-detail/Multilayer-Ceramic-Capacitors-MLCC---SMD-SMT_Murata-Electronics-Murata-Electronics-GRM0335C1E561GA01D_C426059.html
footprint CAP-0201 (0201 (0603M) Capacitor)
pins: 1, 2

## GRM0335C1E680FA01D
designator C?  Capacitance: 68pF  (hidden comment: *)
Capacitor, Ceramic (MLCC), 68pF, ±1%, 25V, C0G, ±1%, SMD 0201; Manufacturer: Murata Electronics; Manufacturer Part Number: GRM0335C1E680FA01D; Package Size: 0201; JLCPCB Basic Part: No; JLCPCB Part Number: C710803; Supplier 1: LCSC; Category: Capacitors - MLCC; Supplier Part Number 1: C710803; Tolerance: ±1%; Voltage Rating: 25V; Temperature Coefficient: C0G; RoHS: Yes; ComponentLink1Description: Datasheet; ComponentLink1URL: https://wmsc.lcsc.com/wmsc/upload/file/pdf/v2/lcsc/2210190600_Murata-Electronics-GRM0335C1E680FA01D_C710803.pdf; ComponentLink2Description: JLCPCB Part URL; ComponentLink2URL: https://jlcpcb.com/partdetail/C710803; ComponentLink3Description: LCSC Part URL; ComponentLink3URL: https://lcsc.com/product-detail/Multilayer-Ceramic-Capacitors-MLCC---SMD-SMT_Murata-Electronics-Murata-Electronics-GRM0335C1E680FA01D_C710803.html
footprint CAP-0201 (0201 (0603M) Capacitor)
pins: 1, 2

## GRM0335C1E681FA01D
designator C?  Capacitance: 680pF  (hidden comment: *)
Capacitor, Ceramic (MLCC), 680pF, ±1%, 25V, C0G, ±1%, SMD 0201; Manufacturer: Murata Electronics; Manufacturer Part Number: GRM0335C1E681FA01D; Package Size: 0201; JLCPCB Basic Part: No; JLCPCB Part Number: C1864390; Supplier 1: LCSC; Category: Capacitors - MLCC; Supplier Part Number 1: C1864390; Tolerance: ±1%; Voltage Rating: 25V; Temperature Coefficient: C0G; RoHS: Yes; ComponentLink1Description: Datasheet; ComponentLink2Description: JLCPCB Part URL; ComponentLink2URL: https://jlcpcb.com/partdetail/C1864390; ComponentLink3Description: LCSC Part URL; ComponentLink3URL: https://lcsc.com/product-detail/Multilayer-Ceramic-Capacitors-MLCC---SMD-SMT_Murata-Electronics-Murata-Electronics-GRM0335C1E681FA01D_C1864390.html
footprint CAP-0201 (0201 (0603M) Capacitor)
pins: 1, 2

## GRM0335C1E681JA01D
designator C?  Capacitance: 680pF  (hidden comment: *)
Capacitor, Ceramic (MLCC), 680pF, ±5%, 25V, C0G, ±5%, SMD 0201; Manufacturer: Murata Electronics; Manufacturer Part Number: GRM0335C1E681JA01D; Package Size: 0201; JLCPCB Basic Part: No; JLCPCB Part Number: C384952; Supplier 1: LCSC; Category: Capacitors - MLCC; Supplier Part Number 1: C384952; Tolerance: ±5%; Voltage Rating: 25V; Temperature Coefficient: C0G; RoHS: Yes; ComponentLink1Description: Datasheet; ComponentLink1URL: https://wmsc.lcsc.com/wmsc/upload/file/pdf/v2/lcsc/2304140030_Murata-Electronics-GRM0335C1E681JA01D_C384952.pdf; ComponentLink2Description: JLCPCB Part URL; ComponentLink2URL: https://jlcpcb.com/partdetail/C384952; ComponentLink3Description: LCSC Part URL; ComponentLink3URL: https://lcsc.com/product-detail/Multilayer-Ceramic-Capacitors-MLCC---SMD-SMT_Murata-Electronics-Murata-Electronics-GRM0335C1E681JA01D_C384952.html
footprint CAP-0201 (0201 (0603M) Capacitor)
pins: 1, 2

## GRM0335C1E820FA01D
designator C?  Capacitance: 82pF  (hidden comment: *)
Capacitor, Ceramic (MLCC), 82pF, ±1%, 25V, ±1%, SMD 0201; Manufacturer: Murata Electronics; Manufacturer Part Number: GRM0335C1E820FA01D; Package Size: 0201; JLCPCB Basic Part: No; JLCPCB Part Number: C668340; Supplier 1: LCSC; Category: Capacitors - MLCC; Supplier Part Number 1: C668340; Tolerance: ±1%; Voltage Rating: 25V; RoHS: Yes; ComponentLink1Description: Datasheet; ComponentLink1URL: https://wmsc.lcsc.com/wmsc/upload/file/pdf/v2/lcsc/2109101230_Murata-Electronics-GRM0335C1E820FA01D_C668340.pdf; ComponentLink2Description: JLCPCB Part URL; ComponentLink2URL: https://jlcpcb.com/partdetail/C668340; ComponentLink3Description: LCSC Part URL; ComponentLink3URL: https://lcsc.com/product-detail/Multilayer-Ceramic-Capacitors-MLCC---SMD-SMT_Murata-Electronics-Murata-Electronics-GRM0335C1E820FA01D_C668340.html
footprint CAP-0201 (0201 (0603M) Capacitor)
pins: 1, 2

## GRM0335C1E820JA01D
designator C?  Capacitance: 82pF  (hidden comment: *)
Capacitor, Ceramic (MLCC), 82pF, ±5%, 25V, C0G, ±5%, SMD 0201; Manufacturer: Murata Electronics; Manufacturer Part Number: GRM0335C1E820JA01D; Package Size: 0201; JLCPCB Basic Part: No; JLCPCB Part Number: C161397; Supplier 1: LCSC; Category: Capacitors - MLCC; Supplier Part Number 1: C161397; Tolerance: ±5%; Voltage Rating: 25V; Temperature Coefficient: C0G; RoHS: Yes; ComponentLink1Description: Datasheet; ComponentLink1URL: https://wmsc.lcsc.com/wmsc/upload/file/pdf/v2/lcsc/2304140030_Murata-Electronics-GRM0335C1E820JA01D_C161397.pdf; ComponentLink2Description: JLCPCB Part URL; ComponentLink2URL: https://jlcpcb.com/partdetail/C161397; ComponentLink3Description: LCSC Part URL; ComponentLink3URL: https://lcsc.com/product-detail/Multilayer-Ceramic-Capacitors-MLCC---SMD-SMT_Murata-Electronics-Murata-Electronics-GRM0335C1E820JA01D_C161397.html
footprint CAP-0201 (0201 (0603M) Capacitor)
pins: 1, 2

## GRM0335C1E821JA01D
designator C?  Capacitance: 820pF  (hidden comment: *)
Capacitor, Ceramic (MLCC), 820pF, ±5%, 25V, C0G, ±5%, SMD 0201; Manufacturer: Murata Electronics; Manufacturer Part Number: GRM0335C1E821JA01D; Package Size: 0201; JLCPCB Basic Part: No; JLCPCB Part Number: C384953; Supplier 1: LCSC; Category: Capacitors - MLCC; Supplier Part Number 1: C384953; Tolerance: ±5%; Voltage Rating: 25V; Temperature Coefficient: C0G; RoHS: Yes; ComponentLink1Description: Datasheet; ComponentLink1URL: https://wmsc.lcsc.com/wmsc/upload/file/pdf/v2/lcsc/2304140030_Murata-Electronics-GRM0335C1E821JA01D_C384953.pdf; ComponentLink2Description: JLCPCB Part URL; ComponentLink2URL: https://jlcpcb.com/partdetail/C384953; ComponentLink3Description: LCSC Part URL; ComponentLink3URL: https://lcsc.com/product-detail/Multilayer-Ceramic-Capacitors-MLCC---SMD-SMT_Murata-Electronics-Murata-Electronics-GRM0335C1E821JA01D_C384953.html
footprint CAP-0201 (0201 (0603M) Capacitor)
pins: 1, 2

## GRM0335C1ER10WA01D
designator C?  Capacitance: 0.1pF  (hidden comment: *)
Capacitor, Ceramic (MLCC), 0.1pF, 25V, null, SMD 0201; Manufacturer: Murata Electronics; Manufacturer Part Number: GRM0335C1ER10WA01D; Package Size: 0201; JLCPCB Basic Part: No; JLCPCB Part Number: C237564; Supplier 1: LCSC; Category: Capacitors - MLCC; Supplier Part Number 1: C237564; Voltage Rating: 25V; Temperature Coefficient: null; RoHS: Yes; ComponentLink1Description: Datasheet; ComponentLink1URL: https://wmsc.lcsc.com/wmsc/upload/file/pdf/v2/lcsc/2105241141_Murata-Electronics-GRM0335C1ER10WA01D_C237564.pdf; ComponentLink2Description: JLCPCB Part URL; ComponentLink2URL: https://jlcpcb.com/partdetail/C237564; ComponentLink3Description: LCSC Part URL; ComponentLink3URL: https://lcsc.com/product-detail/Multilayer-Ceramic-Capacitors-MLCC---SMD-SMT_Murata-Electronics-Murata-Electronics-GRM0335C1ER10WA01D_C237564.html
footprint CAP-0201 (0201 (0603M) Capacitor)
pins: 1, 2

## GRM0335C1ER20BA01D
designator C?  Capacitance: 0.2pF  (hidden comment: *)
Capacitor, Ceramic (MLCC), 0.2pF, 25V, C0G, SMD 0201; Manufacturer: Murata Electronics; Manufacturer Part Number: GRM0335C1ER20BA01D; Package Size: 0201; JLCPCB Basic Part: No; JLCPCB Part Number: C237565; Supplier 1: LCSC; Category: Capacitors - MLCC; Supplier Part Number 1: C237565; Voltage Rating: 25V; Temperature Coefficient: C0G; RoHS: Yes; ComponentLink1Description: Datasheet; ComponentLink1URL: https://wmsc.lcsc.com/wmsc/upload/file/pdf/v2/lcsc/2304140030_Murata-Electronics-GRM0335C1ER20BA01D_C237565.pdf; ComponentLink2Description: JLCPCB Part URL; ComponentLink2URL: https://jlcpcb.com/partdetail/C237565; ComponentLink3Description: LCSC Part URL; ComponentLink3URL: https://lcsc.com/product-detail/Multilayer-Ceramic-Capacitors-MLCC---SMD-SMT_Murata-Electronics-Murata-Electronics-GRM0335C1ER20BA01D_C237565.html
footprint CAP-0201 (0201 (0603M) Capacitor)
pins: 1, 2

## GRM0335C1ER30BA01D
designator C?  Capacitance: 0.3pF  (hidden comment: *)
Capacitor, Ceramic (MLCC), 0.3pF, 25V, C0G, SMD 0201; Manufacturer: Murata Electronics; Manufacturer Part Number: GRM0335C1ER30BA01D; Package Size: 0201; JLCPCB Basic Part: No; JLCPCB Part Number: C88909; Supplier 1: LCSC; Category: Capacitors - MLCC; Supplier Part Number 1: C88909; Voltage Rating: 25V; Temperature Coefficient: C0G; RoHS: Yes; ComponentLink1Description: Datasheet; ComponentLink1URL: https://wmsc.lcsc.com/wmsc/upload/file/pdf/v2/lcsc/2304140030_Murata-Electronics-GRM0335C1ER30BA01D_C88909.pdf; ComponentLink2Description: JLCPCB Part URL; ComponentLink2URL: https://jlcpcb.com/partdetail/C88909; ComponentLink3Description: LCSC Part URL; ComponentLink3URL: https://lcsc.com/product-detail/Multilayer-Ceramic-Capacitors-MLCC---SMD-SMT_Murata-Electronics-Murata-Electronics-GRM0335C1ER30BA01D_C88909.html
footprint CAP-0201 (0201 (0603M) Capacitor)
pins: 1, 2

## GRM0335C1ER30WA01D
designator C?  Capacitance: 0.3pF  (hidden comment: *)
Capacitor, Ceramic (MLCC), 0.3pF, 25V, C0G, SMD 0201; Manufacturer: Murata Electronics; Manufacturer Part Number: GRM0335C1ER30WA01D; Package Size: 0201; JLCPCB Basic Part: No; JLCPCB Part Number: C161401; Supplier 1: LCSC; Category: Capacitors - MLCC; Supplier Part Number 1: C161401; Voltage Rating: 25V; Temperature Coefficient: C0G; RoHS: Yes; ComponentLink1Description: Datasheet; ComponentLink1URL: https://wmsc.lcsc.com/wmsc/upload/file/pdf/v2/lcsc/1811081511_Murata-Electronics-GRM0335C1ER30WA01D_C161401.pdf; ComponentLink2Description: JLCPCB Part URL; ComponentLink2URL: https://jlcpcb.com/partdetail/C161401; ComponentLink3Description: LCSC Part URL; ComponentLink3URL: https://lcsc.com/product-detail/Multilayer-Ceramic-Capacitors-MLCC---SMD-SMT_Murata-Electronics-Murata-Electronics-GRM0335C1ER30WA01D_C161401.html
footprint CAP-0201 (0201 (0603M) Capacitor)
pins: 1, 2

## GRM0335C1ER50CA01D
designator C?  Capacitance: 0.5pF  (hidden comment: *)
Capacitor, Ceramic (MLCC), 0.5pF, 25V, C0G, SMD 0201; Manufacturer: Murata Electronics; Manufacturer Part Number: GRM0335C1ER50CA01D; Package Size: 0201; JLCPCB Basic Part: No; JLCPCB Part Number: C237566; Supplier 1: LCSC; Category: Capacitors - MLCC; Supplier Part Number 1: C237566; Voltage Rating: 25V; Temperature Coefficient: C0G; RoHS: Yes; ComponentLink1Description: Datasheet; ComponentLink1URL: https://wmsc.lcsc.com/wmsc/upload/file/pdf/v2/lcsc/2304140030_Murata-Electronics-GRM0335C1ER50CA01D_C237566.pdf; ComponentLink2Description: JLCPCB Part URL; ComponentLink2URL: https://jlcpcb.com/partdetail/C237566; ComponentLink3Description: LCSC Part URL; ComponentLink3URL: https://lcsc.com/product-detail/Multilayer-Ceramic-Capacitors-MLCC---SMD-SMT_Murata-Electronics-Murata-Electronics-GRM0335C1ER50CA01D_C237566.html
footprint CAP-0201 (0201 (0603M) Capacitor)
pins: 1, 2

## GRM0335C1ER50WA01D
designator C?  Capacitance: 0.5pF  (hidden comment: *)
Capacitor, Ceramic (MLCC), 0.5pF, 25V, C0G, SMD 0201; Manufacturer: Murata Electronics; Manufacturer Part Number: GRM0335C1ER50WA01D; Package Size: 0201; JLCPCB Basic Part: No; JLCPCB Part Number: C710806; Supplier 1: LCSC; Category: Capacitors - MLCC; Supplier Part Number 1: C710806; Voltage Rating: 25V; Temperature Coefficient: C0G; RoHS: Yes; ComponentLink1Description: Datasheet; ComponentLink1URL: https://wmsc.lcsc.com/wmsc/upload/file/pdf/v2/lcsc/2201111430_Murata-Electronics-GRM0335C1ER50WA01D_C710806.pdf; ComponentLink2Description: JLCPCB Part URL; ComponentLink2URL: https://jlcpcb.com/partdetail/C710806; ComponentLink3Description: LCSC Part URL; ComponentLink3URL: https://lcsc.com/product-detail/Multilayer-Ceramic-Capacitors-MLCC---SMD-SMT_Murata-Electronics-Murata-Electronics-GRM0335C1ER50WA01D_C710806.html
footprint CAP-0201 (0201 (0603M) Capacitor)
pins: 1, 2

## GRM0335C1ER70BA01D
designator C?  Capacitance: 0.7pF  (hidden comment: *)
Capacitor, Ceramic (MLCC), 0.7pF, 25V, null, SMD 0201; Manufacturer: Murata Electronics; Manufacturer Part Number: GRM0335C1ER70BA01D; Package Size: 0201; JLCPCB Basic Part: No; JLCPCB Part Number: C2171587; Supplier 1: LCSC; Category: Capacitors - MLCC; Supplier Part Number 1: C2171587; Voltage Rating: 25V; Temperature Coefficient: null; RoHS: Yes; ComponentLink1Description: Datasheet; ComponentLink1URL: https://wmsc.lcsc.com/wmsc/upload/file/pdf/v2/lcsc/2202040530_Murata-Electronics-GRM0335C1ER70BA01D_C2171587.pdf; ComponentLink2Description: JLCPCB Part URL; ComponentLink2URL: https://jlcpcb.com/partdetail/C2171587; ComponentLink3Description: LCSC Part URL; ComponentLink3URL: https://lcsc.com/product-detail/Multilayer-Ceramic-Capacitors-MLCC---SMD-SMT_Murata-Electronics-Murata-Electronics-GRM0335C1ER70BA01D_C2171587.html
footprint CAP-0201 (0201 (0603M) Capacitor)
pins: 1, 2

## GRM0335C1ER75BA01D
designator C?  Capacitance: 0.75pF  (hidden comment: *)
Capacitor, Ceramic (MLCC), 0.75pF, 25V, C0G, SMD 0201; Manufacturer: Murata Electronics; Manufacturer Part Number: GRM0335C1ER75BA01D; Package Size: 0201; JLCPCB Basic Part: No; JLCPCB Part Number: C337489; Supplier 1: LCSC; Category: Capacitors - MLCC; Supplier Part Number 1: C337489; Voltage Rating: 25V; Temperature Coefficient: C0G; RoHS: Yes; ComponentLink1Description: Datasheet; ComponentLink1URL: https://wmsc.lcsc.com/wmsc/upload/file/pdf/v2/lcsc/2304140030_Murata-Electronics-GRM0335C1ER75BA01D_C337489.pdf; ComponentLink2Description: JLCPCB Part URL; ComponentLink2URL: https://jlcpcb.com/partdetail/C337489; ComponentLink3Description: LCSC Part URL; ComponentLink3URL: https://lcsc.com/product-detail/Multilayer-Ceramic-Capacitors-MLCC---SMD-SMT_Murata-Electronics-Murata-Electronics-GRM0335C1ER75BA01D_C337489.html
footprint CAP-0201 (0201 (0603M) Capacitor)
pins: 1, 2

## GRM0335C1ER80BA01D
designator C?  Capacitance: 0.8pF  (hidden comment: *)
Capacitor, Ceramic (MLCC), 0.8pF, 25V, null, SMD 0201; Manufacturer: Murata Electronics; Manufacturer Part Number: GRM0335C1ER80BA01D; Package Size: 0201; JLCPCB Basic Part: No; JLCPCB Part Number: C161402; Supplier 1: LCSC; Category: Capacitors - MLCC; Supplier Part Number 1: C161402; Voltage Rating: 25V; Temperature Coefficient: null; RoHS: Yes; ComponentLink1Description: Datasheet; ComponentLink1URL: https://wmsc.lcsc.com/wmsc/upload/file/pdf/v2/lcsc/2103161004_Murata-Electronics-GRM0335C1ER80BA01D_C161402.pdf; ComponentLink2Description: JLCPCB Part URL; ComponentLink2URL: https://jlcpcb.com/partdetail/C161402; ComponentLink3Description: LCSC Part URL; ComponentLink3URL: https://lcsc.com/product-detail/Multilayer-Ceramic-Capacitors-MLCC---SMD-SMT_Murata-Electronics-Murata-Electronics-GRM0335C1ER80BA01D_C161402.html
footprint CAP-0201 (0201 (0603M) Capacitor)
pins: 1, 2

## GRM0335C1ER80WA01D
designator C?  Capacitance: 0.8pF  (hidden comment: *)
Capacitor, Ceramic (MLCC), 0.8pF, 25V, null, SMD 0201; Manufacturer: Murata Electronics; Manufacturer Part Number: GRM0335C1ER80WA01D; Package Size: 0201; JLCPCB Basic Part: No; JLCPCB Part Number: C710807; Supplier 1: LCSC; Category: Capacitors - MLCC; Supplier Part Number 1: C710807; Voltage Rating: 25V; Temperature Coefficient: null; RoHS: Yes; ComponentLink1Description: Datasheet; ComponentLink1URL: https://wmsc.lcsc.com/wmsc/upload/file/pdf/v2/lcsc/2103161034_Murata-Electronics-GRM0335C1ER80WA01D_C710807.pdf; ComponentLink2Description: JLCPCB Part URL; ComponentLink2URL: https://jlcpcb.com/partdetail/C710807; ComponentLink3Description: LCSC Part URL; ComponentLink3URL: https://lcsc.com/product-detail/Multilayer-Ceramic-Capacitors-MLCC---SMD-SMT_Murata-Electronics-Murata-Electronics-GRM0335C1ER80WA01D_C710807.html
footprint CAP-0201 (0201 (0603M) Capacitor)
pins: 1, 2

## GRM0335C1H1R0BA01D
designator C?  Capacitance: 1pF  (hidden comment: *)
Capacitor, Ceramic (MLCC), 1pF, 50V, C0G, SMD 0201; Manufacturer: Murata Electronics; Manufacturer Part Number: GRM0335C1H1R0BA01D; Package Size: 0201; JLCPCB Basic Part: No; JLCPCB Part Number: C85893; Supplier 1: LCSC; Category: Capacitors - MLCC; Supplier Part Number 1: C85893; Voltage Rating: 50V; Temperature Coefficient: C0G; RoHS: Yes; ComponentLink1Description: Datasheet; ComponentLink1URL: https://wmsc.lcsc.com/wmsc/upload/file/pdf/v2/lcsc/2304140030_Murata-Electronics-GRM0335C1H1R0BA01D_C85893.pdf; ComponentLink2Description: JLCPCB Part URL; ComponentLink2URL: https://jlcpcb.com/partdetail/C85893; ComponentLink3Description: LCSC Part URL; ComponentLink3URL: https://lcsc.com/product-detail/Multilayer-Ceramic-Capacitors-MLCC---SMD-SMT_Murata-Electronics-Murata-Electronics-GRM0335C1H1R0BA01D_C85893.html
footprint CAP-0201 (0201 (0603M) Capacitor)
pins: 1, 2
